# Altium footprint library Sigma_Library.PcbLib: 125 footprints (part 1 of 8)
Each footprint in its own frame and in the unit in brackets; x right, y up, seen from the top. Pads: shape width x height; smd on the part's side, far side on the other; paste and mask are expansions set on the pad; w line width, h text height; cw(c..) or ccw(c..) is an arc to the next point about the centre after c.
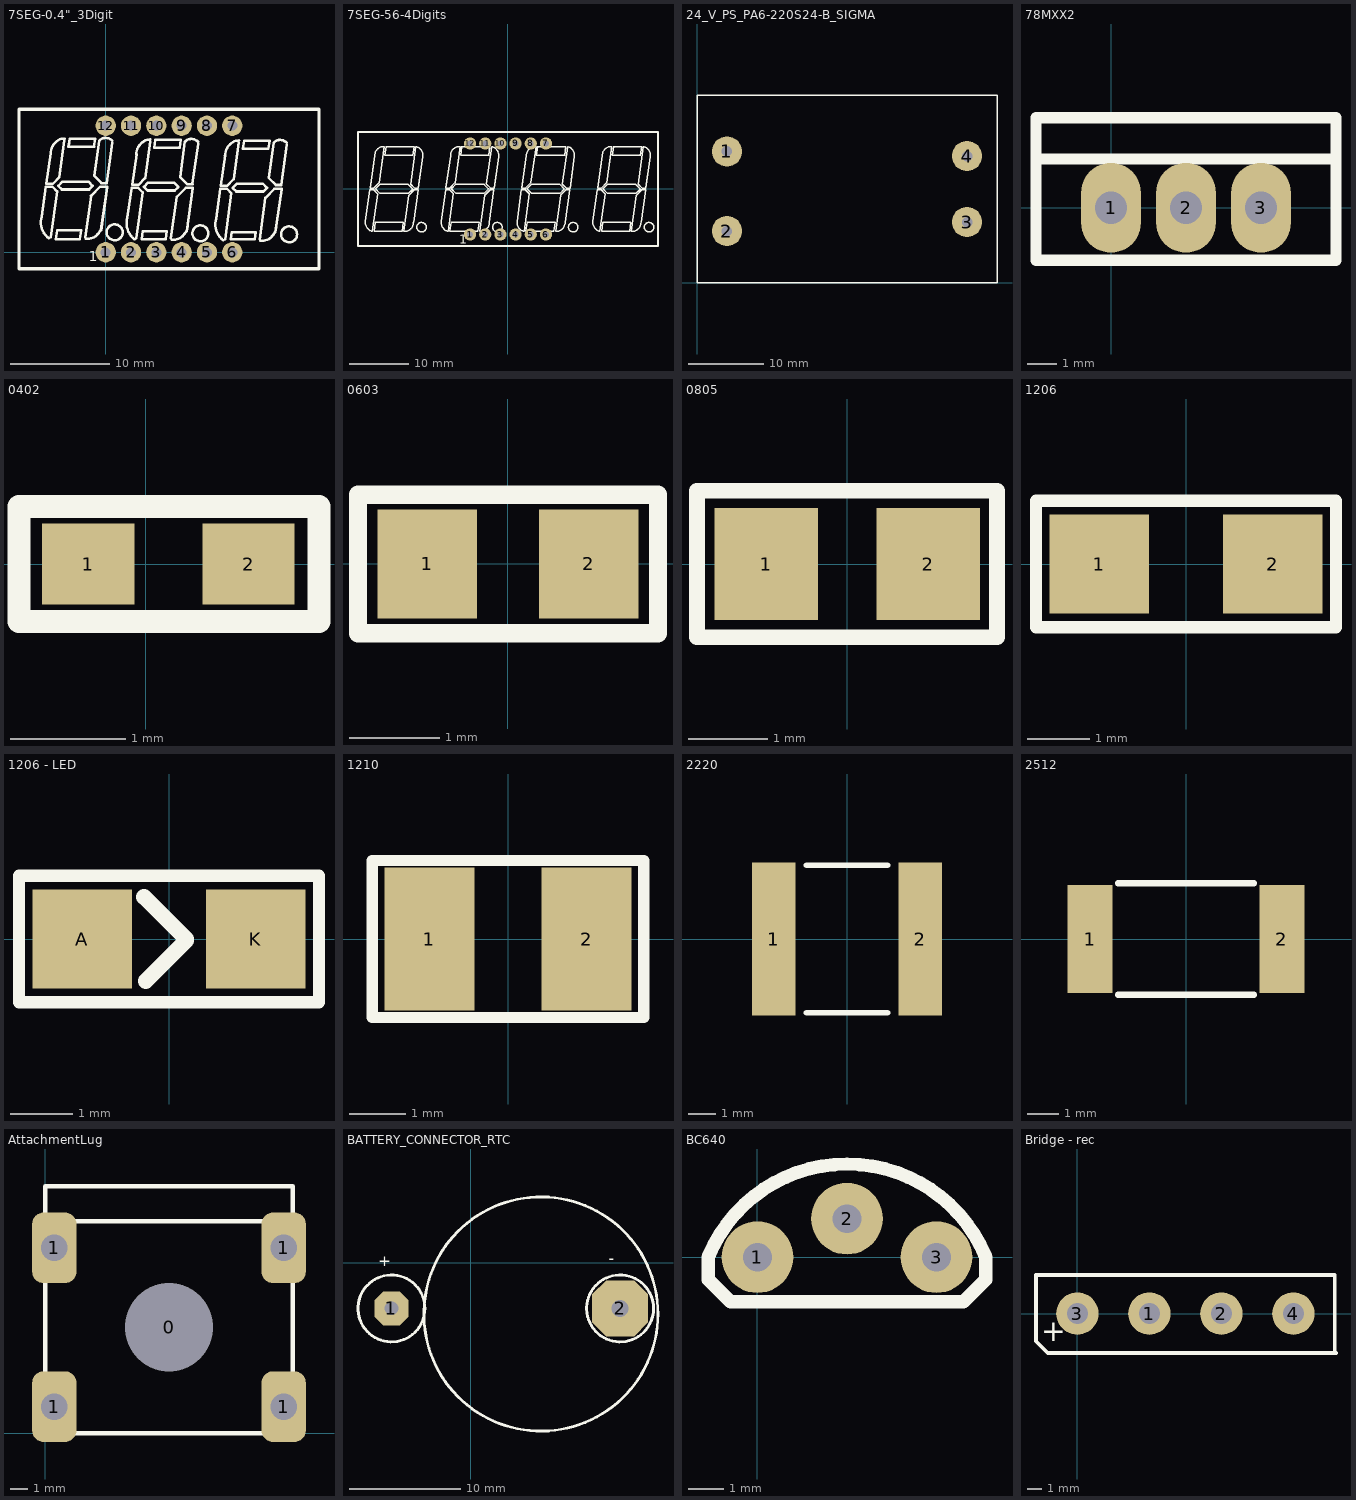
[diagram p0: the footprints below, top view; thin cyan lines are the x and y axes]

## 7SEG-0.4"_3Digit [mil]
pads (12):
  round 80 hole 39.37: 1(0,0) 2(100,0) 3(200,0) 4(300,0) 5(400,0) 6(500,0) 7(500,500) 8(400,500) 9(300,500) 10(200,500) 11(100,500) 12(0,500)
Top Overlay:
  circle w10: c35.43,78.74 r31.43
  circle w10: c374.02,74.8 r31.43
  circle w10: c724.41,70.87 r31.43
  lines w10: -252.78,141.32 ccw(c-177.97,118.17) -224.41,55.12 ; -252.65,141.27 -236.12,258.88 -210.5,258.88 -192.37,240.76 -217.65,59.21 ; -217.79,389.17 cw(c-156.36,389.17) -199.8,432.61 ; -216.92,390.93 -233.99,270.49 -209.32,270.49 -183.1,296.71 -162.85,441.15 ; -197.51,434.89 cw(c-162.46,399.84) -162.46,449.41 ; -100.46,87.48 -191.5,87.48 -196.56,51.18 -102.07,51.18 -97.01,87.48 ; -81.09,58.83 -58.06,223.1 -22.27,258.89 2.4,258.89 ; -78.1,54.23 ccw(c-69.98,103.14) -34.93,68.08 ; -32.65,70.36 ccw(c-76.09,113.8) -14.66,113.8 ; -25.49,440.8 -44.88,301.51 -16.99,273.62 4.95,273.62 ; -25.28,440.77 cw(c0,417.32) 26.18,439.76 ; -18.59,86.24 5.81,258.4 ; 3.81,273.78 26.14,432.72 ; 85.8,137.38 ccw(c160.61,114.24) 114.17,51.18 ; 85.93,137.34 102.46,254.95 128.09,254.95 146.21,236.82 120.93,55.27 ; 120.79,385.23 cw(c182.23,385.23) 138.79,428.67 ; 121.66,387 104.59,266.56 129.26,266.56 155.48,292.78 175.73,437.21 ; 141.07,430.95 cw(c176.12,395.9) 176.12,445.47 ; 238.12,83.55 147.08,83.55 142.57,51.18 237.06,51.18 241.57,83.55 ; 257.5,54.9 280.53,219.16 316.31,254.95 340.98,254.95 ; 260.48,50.29 ccw(c268.6,99.2) 303.65,64.15 ; 305.93,66.43 ccw(c262.49,109.87) 323.93,109.87 ; 313.1,436.86 293.7,297.57 321.59,269.69 343.53,269.69 ; 313.3,436.83 cw(c338.58,413.39) 364.76,435.83 ; 319.99,82.31 344.39,254.47 ; 342.39,269.84 364.73,428.78 ; 436.19,133.44 ccw(c511.01,110.3) 464.57,47.24 ; 436.33,133.4 452.85,251.01 478.48,251.01 496.6,232.88 471.33,51.34 ; 471.19,381.29 cw(c532.62,381.29) 489.18,424.73 ; 472.06,383.06 454.98,262.62 479.65,262.62 505.87,288.84 526.12,433.27 ; 491.46,427.02 cw(c526.52,391.96) 526.52,441.54 ; 588.52,79.61 497.48,79.61 493.51,51.18 588,51.18 591.96,79.61 ; 607.89,50.96 630.92,215.23 666.71,251.01 691.38,251.01 ; 610.88,46.36 ccw(c618.99,95.26) 654.05,60.21 ; 656.33,62.49 ccw(c612.89,105.93) 674.32,105.93 ; 663.49,432.93 644.1,293.63 671.98,265.75 693.92,265.75 ; 663.7,432.9 cw(c688.98,409.45) 715.16,431.89 ; 670.38,78.37 694.79,250.53 ; 692.79,265.91 715.12,424.84 ; -187.55,262.68 -170.7,279.53 -68.61,279.53 -51.44,262.36 -65.77,248.03 -172.9,248.03 -187.55,262.68 ; -146.98,416.95 -142.28,448.82 -41.62,448.82 -46.32,416.95 -146.98,416.95 ; 151.03,258.74 165.68,244.09 272.82,244.09 287.14,258.42 269.97,275.59 167.89,275.59 151.03,258.74 ; 191.6,413.02 292.27,413.02 296.97,444.88 196.3,444.88 191.6,413.02 ; 501.43,254.8 516.07,240.16 623.21,240.16 637.54,254.48 620.36,271.65 518.28,271.65 501.43,254.8 ; 542,409.08 642.66,409.08 647.36,440.94 546.7,440.94 542,409.08
  lines w12: -342.52,-64.96 842.52,-64.96 842.52,564.96 -342.52,564.96 -342.52,-64.96
  text "1" at -66.93,-35.43 h40

## 7SEG-56-4Digits [mil]
height 21.65
pads (12):
  round 80 hole 39.37: 1(-250,-300) 2(-150,-300) 3(-50,-300) 4(50,-300) 5(150,-300) 6(250,-300) 7(250,300) 8(150,300) 9(50,300) 10(-50,300) 11(-150,300) 12(-250,300)
Top Overlay:
  drawing of 192 lines, arcs and shapes, not listed
  text "1" at -320,-360 h60
3D body "4 DIG 7 SEG DISPLAY.stp": height 314.96, standoff -275.59, extent -995.16,-379.01 985.16,369.02

## 24_V_PS_PA6-220S24-B_SIGMA [mm]
pads (4):
  round 4.064 hole 1.4: 1(4,17.5) 2(4,6.9) 3(36,8.1) 4(36,16.9)
Top Overlay:
  lines w0.2: 0,0 40,0 40,25 0,25 0,0
3D body: height 22, standoff 0, extent 0,-0.025 40.005,25.019

## 78MXX2 [mil]
pads (3):
  oval 80x120 hole 43.31: 1(0,0) 2(100,0) 3(200,0)
Top Overlay:
  lines w15: -100,65 300,65 ; -100,-70 -100,120 300,120 300,-70 -100,-70
3D body "LM7805.STEP": height 738.39, standoff -570.28, extent -109.05,-70 311.04,115.04

## 0402 [mm]
pads (2):
  rect 0.8x0.7 smd: 1(-0.5,0) 2(0.889,0)
Top Overlay:
  lines w0.2: -1.1,-0.5 1.5,-0.5 1.5,0.5 -1.1,0.5 -1.1,-0.5
3D body "RESC-0402.stp": height 0.4, standoff 0, extent -0.322,-0.275 0.728,0.275

## 0603 [mm]
pads (2):
  rect 1.1x1.2 smd: 1(-0.889,0) 2(0.889,0)
Top Overlay:
  lines w0.2: -1.651,-0.762 -1.651,0.762 1.651,0.762 1.651,-0.762 -1.651,-0.762
3D body "RESC-0603.stp": height 0.55, standoff 0, extent -0.875,-0.475 0.825,0.425

## 0805 [mm]
pads (2):
  rect 1.3x1.4 smd: 1(-1.016,0) 2(1.016,0)
Top Overlay:
  lines w0.2: -1.885,-0.919 -1.885,0.919 1.88,0.919 1.88,-0.919 -1.885,-0.919
3D body "RESC-0805.stp": height 0.6, standoff 0, extent -1.075,-0.675 1.025,0.675

## 1206 [mm]
pads (2):
  rect 1.6x1.6 smd: 1(-1.397,0) 2(1.397,0)
Top Overlay:
  lines w0.2: -2.413,-1.016 -2.413,1.016 2.413,1.016 2.413,-1.016 -2.413,-1.016
3D body "RESC-1206.stp": height 0.65, standoff 0, extent -1.624,-0.85 1.676,0.85

## 1206 - LED [mm] "D?"
pads (2):
  rect 1.6x1.6 smd: A(-1.397,0) K(1.397,0)
Top Overlay:
  lines w0.2: -2.413,-1.016 2.413,-1.016 2.413,1.016 -2.413,1.016 -2.413,-1.016
  lines w0.254: -0.4,0.675 0.275,0 0.275,-0.025 ; -0.375,-0.675 0.275,-0.025 ; 0.275,-0.025 0.275,-0.025
3D body "APTR3216.stp": height 1.05, standoff 0, extent -1.549,-0.8 1.651,0.8

## 1210 [mil]
pads (2):
  rect 62.99x100 smd: 1(-55,0) 2(55,0)
Top Overlay:
  lines w7.87: -95,-55 -95,55 95,55 95,-55 -95,-55
3D body "RESC-1210.stp": height 23.62, standoff 0, extent -64.96,-53.15 64.96,53.15

## 2220 [mm] "Chip Capacitor, 2-Leads, Body 5.70x5.00mm, IPC Medium Density"
height 2.5
pads (2):
  rect 1.55x5.5 smd: 1(-2.625,0) 2(2.625,0)
Top Overlay:
  lines w0.2: -1.45,-2.65 1.45,-2.65 ; -1.45,2.65 1.45,2.65

## 2512 [mm] "Power SMD Resistor"
pads (2):
  rect 1.45x3.5 smd: 1(-3.1,0) 2(3.1,0)
Top Overlay:
  lines w0.2: -2.2,-1.8 2.2,-1.8 ; -2.2,1.8 2.2,1.8
3D body "RESC-2512.stp": height 0.65, standoff 0, extent -3.175,-1.675 3.225,1.625

## AttachmentLug [mm] "PCB_Lug_14*14mm M4"
height 12
pads (5):
  round 4 hole 5: 0(7,6)
  rrect50% 2.5x4 hole 1.5 square: 1(0.5,1.5) 1(0.5,10.5) 1(13.5,1.5) 1(13.5,10.5)
Top Overlay:
  lines w0.254: 0,12 14,12 ; 0,0 0,14 14,14 14,0 0,0

## BATTERY_CONNECTOR_RTC [mm]
pads (2):
  oct 3.048x3.048 hole 1.219: 1(-7.1,-4.1)
  oct 5.048x5.048 hole 1.5: 2(13.4,-4.1)
Top Overlay:
  circle w0.254: c6.3,-4.6 r10.5
  circle w0.254: c13.4,-4.1 r3
  circle w0.254: c-7.1,-4.1 r3
  text "+" at -8.3,-0.3 h1.02
  text "-" at 12.4,-0.1 h1.02

## BC640 [mil]
pads (3):
  round 80 hole 32: 1(0,0) 2(100,43) 3(200,0)
Top Overlay:
  lines w15: -55,-25 -30,-50 230,-50 255,-25 255,0 ccw(c100,-63.46) -55,0 -55,-25
3D body: height 270.08, standoff 0, extent -0.85,-49.94 195.62,106.95

## Bridge - rec [mm] "KBU610"
height 9.91
pads (4):
  round 3 hole 1.5: 1(5.1,0) 2(10.2,0) 3(0,0) 4(15.3,0)
Top Overlay:
  lines w0.254: -2.93,-1.96 -2.1,-2.79 18.32,-2.79 18.23,-2.7 18.23,2.73 -1.46,2.73 -2.93,2.73 -2.93,-1.96
  text "+" at -2.57,-1.96 h1.52
3D body "GBU.stp": height 21.3, standoff -3, extent -3.479,-2.112 18.821,1.448